# Altium footprint library Semicon-Discrete.pcblib: 205 footprints (part 11 of 13)
Each footprint in its own frame and in the unit in brackets; x right, y up, seen from the top. Pads: shape width x height; smd on the part's side, far side on the other; paste and mask are expansions set on the pad; w line width, h text height; cw(c..) or ccw(c..) is an arc to the next point about the centre after c.
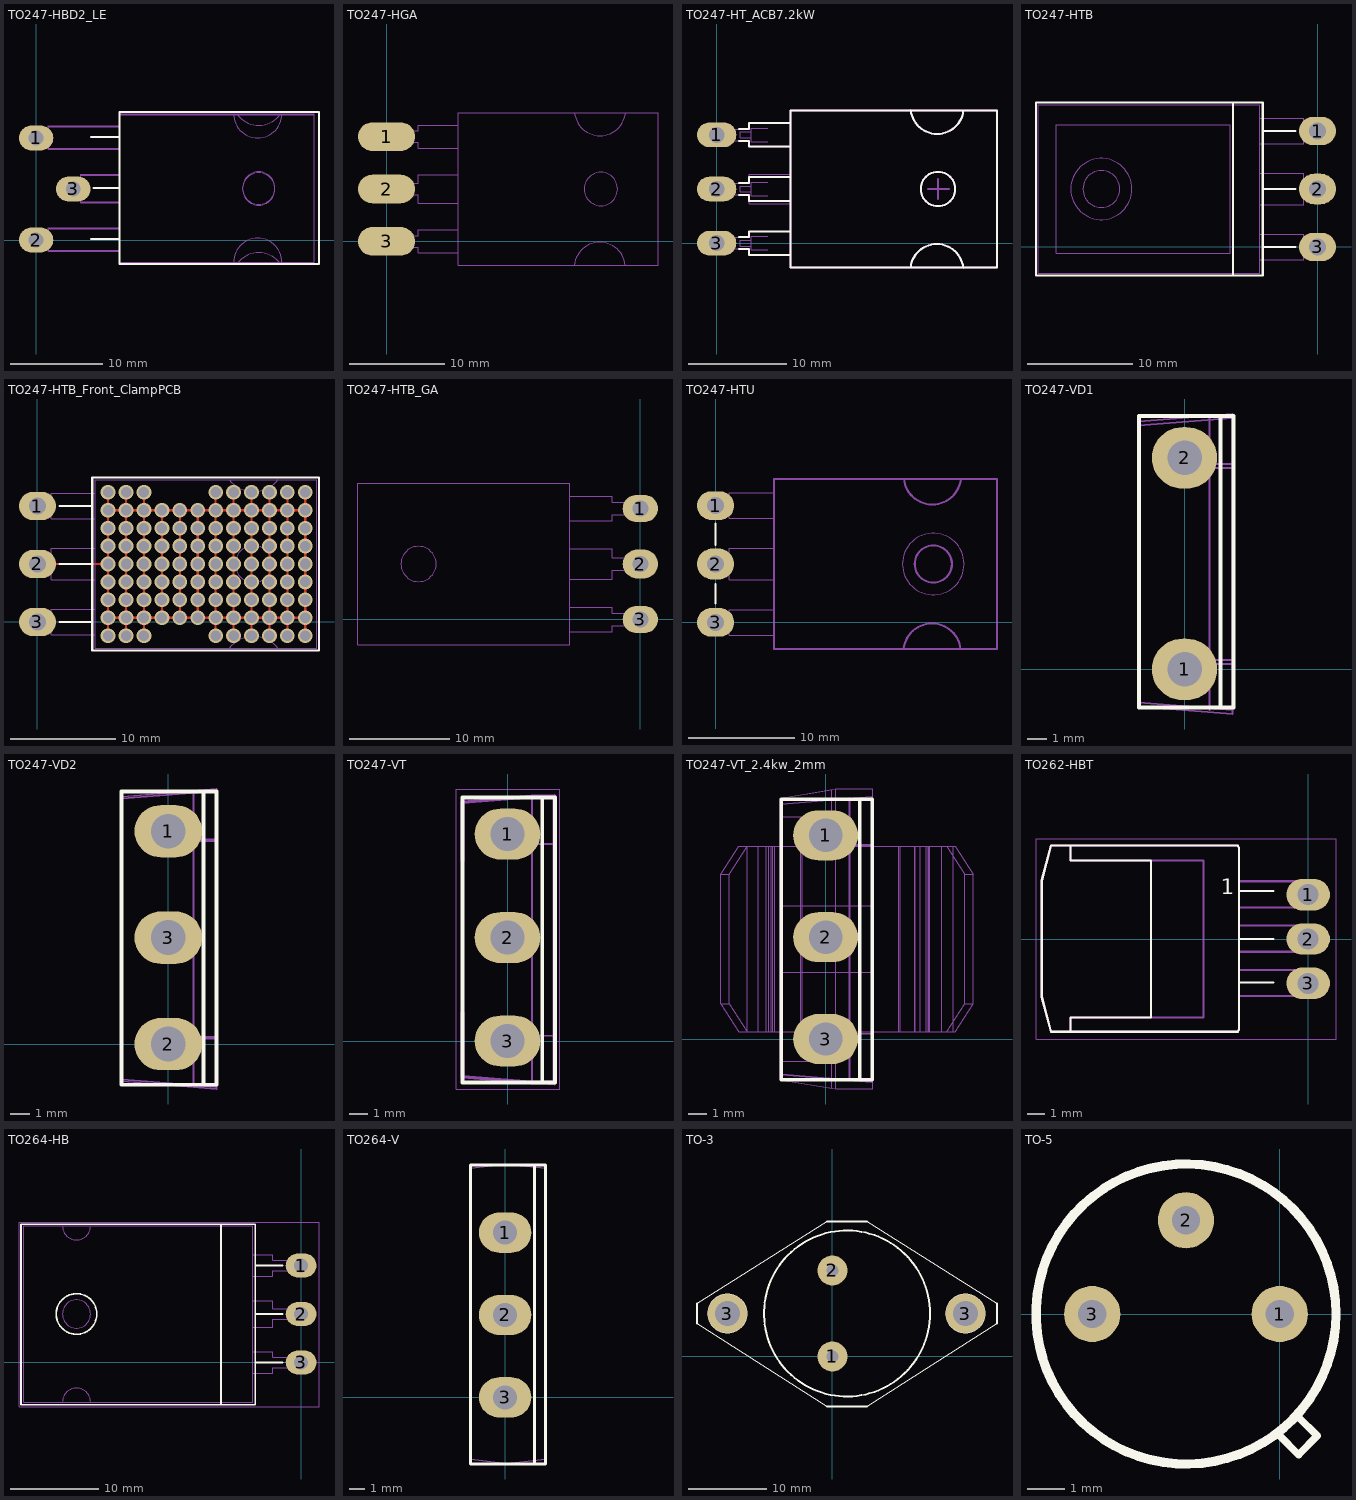
[diagram p10: the footprints below, top view; thin cyan lines are the x and y axes]

## TO247-HBD2_LE [mm]
height 5
pads (3):
  oval 3.7x2.7 hole 1.6: 1(0,11) 2(0,0) 3(4,5.5)
TopOverlay:
  lines w0.2: 5.9,0.1 9,0.1 ; 5.9,11.1 9,11.1 ; 6.2,5.6 9,5.6 ; 9,5.6 9,13.8 30.5,13.8 30.5,-2.6 9,-2.6 9,5.6
TopSolder:
  region: 30.1,13.6 9.1,13.6 9.1,-2.4 30.1,-2.4
2-TopCompOutl:
  circle w0.1: c24,5.5 r1.75
  lines w0.1: 9,-1.2 1.3,-1.2 1.3,-0.6 0,-0.6 0,0 0,0.6 1.3,0.6 1.3,1.2 9,1.2 ; 9,4 4.8,4 4.8,4.9 3.5,4.9 3.5,5.5 3.5,6.1 4.8,6.1 4.8,7 9,7 ; 9,9.8 1.3,9.8 1.3,10.4 0,10.4 0,11 0,11.6 1.3,11.6 1.3,12.2 9,12.2 ; 21.7,-2.5 cw(c24,-4.3) 26.336,-2.548 ; 21.7,13.5 ccw(c24,15.3) 26.336,13.548 ; 9,-2.5 9,13.5 30,13.5 30,-2.5 9,-2.5
4-TopCourty:
  lines w0.1: -0.525,0 0.525,0 ; 0,-0.525 0,0.525
7-TopAssy:
  circle w0.1: c24,5.6 r1.75
  lines w0.1: 9,-1.1 1.3,-1.1 1.3,-0.5 0,-0.5 0,0.1 0,0.7 1.3,0.7 1.3,1.3 9,1.3 ; 9,4.1 4.8,4.1 4.8,5 3.5,5 3.5,5.6 3.5,6.2 4.8,6.2 4.8,7.1 9,7.1 ; 9,9.9 1.3,9.9 1.3,10.5 0,10.5 0,11.1 0,11.7 1.3,11.7 1.3,12.3 9,12.3 ; 21.3,-2.4 cw(c23.9,-2.4) 26.5,-2.4 ; 21.3,13.6 ccw(c23.9,13.6) 26.5,13.6 ; 9,-2.4 9,13.6 30,13.6 30,-2.4 9,-2.4
  text ".Designator" at 10.25,3.925 h2.2
3D body "TO247-HBD2_LE.STEP": height 3.65, standoff -3.2, extent -0.4,-2.6 30.9,13.6

## TO247-HGA [mm] "TO247 Horisontaly Mounted Resesed In PCB"
height 5
pads (3):
  oval 6x3 smd: 1(0,11) 2(0,5.5) 3(0,0)
2-TopCompOutl:
  circle w0.1: c22.5,5.5 r1.75
  lines w0.1: 7.5,-1.2 3.3,-1.2 3.3,-0.6 -1.6,-0.6 -1.6,0 -1.6,0.6 3.3,0.6 3.3,1.2 7.5,1.2 ; 7.5,4 3.3,4 3.3,4.9 -1.6,4.9 -1.6,5.5 -1.6,6.1 3.3,6.1 3.3,7 7.5,7 ; 7.5,9.8 3.3,9.8 3.3,10.4 -1.6,10.4 -1.6,11 -1.6,11.6 3.3,11.6 3.3,12.2 7.5,12.2 ; 19.7,-2.5 cw(c22.383,-2.798) 25.069,-2.52 ; 19.731,13.52 ccw(c22.417,13.798) 25.1,13.5 ; 7.5,-2.5 7.5,13.5 28.5,13.5 28.5,-2.5 7.5,-2.5
4-TopCourty:
  lines w0.1: -0.525,0 0.525,0 ; 0,-0.525 0,0.525
7-TopAssy:
  circle w0.1: c22.5,5.5 r1.75
  lines w0.1: 7.5,-1.2 3.3,-1.2 3.3,-0.6 -1.6,-0.6 -1.6,0 -1.6,0.6 3.3,0.6 3.3,1.2 7.5,1.2 ; 7.5,4 3.3,4 3.3,4.9 -1.6,4.9 -1.6,5.5 -1.6,6.1 3.3,6.1 3.3,7 7.5,7 ; 7.5,9.8 3.3,9.8 3.3,10.4 -1.6,10.4 -1.6,11 -1.6,11.6 3.3,11.6 3.3,12.2 7.5,12.2 ; 19.7,-2.5 cw(c22.383,-2.798) 25.069,-2.52 ; 19.731,13.52 ccw(c22.417,13.798) 25.1,13.5 ; 7.5,-2.5 7.5,13.5 28.5,13.5 28.5,-2.5 7.5,-2.5
  text ".Designator" at 8.85,4.925 h2.2

## TO247-HT_ACB7.2kW [mm] "TO247 Horisontaly Mounted Resesed In PCB"
height 5
pads (3):
  oval 4x2.5 hole 1.6: 1(0,11) 2(0,5.5) 3(0,0)
TopOverlay:
  circle w0.2: c22.5,5.5 r1.75
  circle w0.2: c22.5,5.5 r1.75
  lines w0.2: 2.25,-0.6 3.3,-0.6 3.3,-1.2 7.5,-1.2 ; 2.25,0.6 3.3,0.6 3.3,1.2 7.5,1.2 ; 2.25,4.9 3.3,4.9 3.3,4.3 7.5,4.3 ; 2.25,6.1 3.3,6.1 3.3,6.7 7.5,6.7 ; 2.25,10.4 3.3,10.4 3.3,9.8 7.5,9.8 ; 2.25,11.6 3.3,11.6 3.3,12.2 7.5,12.2 ; 7.5,-2.5 28.5,-2.5 ; 7.5,-2.5 7.5,13.5 ; 7.5,-2.5 28.5,-2.5 ; 7.5,-2.5 7.5,13.5 ; 7.5,13.5 28.5,13.5 ; 7.5,13.5 28.5,13.5 ; 28.5,-2.5 28.5,13.5 ; 28.5,-2.5 28.5,13.5 ; 19.7,-2.5 cw(c22.383,-2.798) 25.069,-2.52 ccw(c22.383,-2.798) 19.7,-2.5 ; 19.731,13.52 ccw(c22.417,13.798) 25.1,13.5 cw(c22.417,13.798) 19.731,13.52
BottomOverlay:
  lines w0.2: 2.375,-0.625 3.05,-0.625 3.05,-1.25 3.45,-1.25 ; 2.375,0.6 3.05,0.6 3.05,1.225 3.45,1.225 ; 2.375,4.85 3.05,4.85 3.05,4.225 3.45,4.225 ; 2.375,6.075 3.05,6.075 3.05,6.7 3.45,6.7 ; 2.375,10.375 3.05,10.375 3.05,9.75 3.45,9.75 ; 2.375,11.6 3.05,11.6 3.05,12.225 3.45,12.225 ; 3.975,-1.225 5.375,-1.225 ; 3.975,1.2 5.375,1.2 ; 3.975,4.25 5.375,4.25 ; 3.975,6.675 5.375,6.675 ; 3.975,9.775 5.375,9.775 ; 3.975,12.2 5.375,12.2 ; 6.225,-1.2 7.5,-1.2 ; 6.225,1.175 7.5,1.175 ; 6.225,4.275 7.5,4.275 ; 6.225,6.65 7.5,6.65 ; 6.225,9.8 7.5,9.8 ; 6.225,12.175 7.5,12.175 ; 7.5,-1.625 7.5,-2.5 9.325,-2.5 ; 7.5,-0.7 7.5,1.1 ; 7.5,2.5 7.5,4.3 ; 7.5,5.45 7.5,7.3 ; 7.5,8.625 7.5,10.425 ; 7.5,11.525 7.5,13.5 9.325,13.5 ; 10.475,-2.5 12.275,-2.5 ; 10.475,13.5 12.275,13.5 ; 13.6,-2.5 15.45,-2.5 ; 13.6,13.5 15.45,13.5 ; 16.6,-2.5 18.4,-2.5 ; 16.6,13.5 18.4,13.5 ; 19.725,-2.5 21.575,-2.5 ; 19.725,13.5 21.575,13.5 ; 22.7,-2.5 24.5,-2.5 ; 22.7,13.5 24.5,13.5 ; 25.825,-2.5 28.5,-2.5 28.5,-1.3 ; 25.825,13.5 28.5,13.5 28.5,11.55 ; 28.5,-0.425 28.5,1.375 ; 28.5,2.475 28.5,4.275 ; 28.5,5.425 28.5,7.275 ; 28.5,8.6 28.5,10.4
2-TopCompOutl:
  circle w0.2: c22.5,5.5 r1.75
  lines w0.1: 7.5,-1.2 3.3,-1.2 3.3,-0.6 -0.3,-0.6 -0.3,0 -0.3,0.6 3.3,0.6 3.3,1.2 7.5,1.2 ; 7.5,4 3.3,4 3.3,4.9 -0.3,4.9 -0.3,5.5 -0.3,6.1 3.3,6.1 3.3,7 7.5,7 ; 7.5,9.8 3.3,9.8 3.3,10.4 -0.3,10.4 -0.3,11 -0.3,11.6 3.3,11.6 3.3,12.2 7.5,12.2
  lines w0.2: 19.7,-2.5 cw(c22.383,-2.798) 25.069,-2.52 ; 19.731,13.52 ccw(c22.417,13.798) 25.1,13.5 ; 7.5,-2.5 7.5,13.5 28.5,13.5 28.5,-2.5 7.5,-2.5
4-TopCourty:
  lines w0.1: -0.525,0 0.525,0 ; 0,-0.525 0,0.525
5-MCadOutl:
  lines w0.2: 21.475,5.5 22.5,5.5 ; 22.5,4.475 22.5,5.5 ; 22.5,6.525 22.5,5.5 ; 23.625,5.5 22.5,5.5
7-TopAssy:
  circle w0.2: c22.5,5.5 r1.75
  lines w0.1: 3.5,-0.3 2.4,-0.3 2.4,-0.2 2.4,0.3 3.5,0.3 ; 3.5,5.2 2.4,5.2 2.4,5.3 2.4,5.8 3.5,5.8 ; 3.5,10.7 2.4,10.7 2.4,10.8 2.4,11.3 3.5,11.3 ; 5.2,-0.7 3.5,-0.7 3.5,0 3.5,0.7 5.2,0.7 ; 5.2,4.8 3.5,4.8 3.5,5.5 3.5,6.2 5.2,6.2 ; 5.2,10.3 3.5,10.3 3.5,11 3.5,11.7 5.2,11.7 ; 7.5,-1.2 3.3,-1.2 3.3,-0.6 -0.3,-0.6 -0.3,0 -0.3,0.6 3.3,0.6 3.3,1.2 7.5,1.2 ; 7.5,4 3.3,4 3.3,4.9 -0.3,4.9 -0.3,5.5 -0.3,6.1 3.3,6.1 3.3,7 7.5,7 ; 7.5,9.8 3.3,9.8 3.3,10.4 -0.3,10.4 -0.3,11 -0.3,11.6 3.3,11.6 3.3,12.2 7.5,12.2
  lines w0.2: 19.7,-2.5 cw(c22.383,-2.798) 25.069,-2.52 ; 19.731,13.52 ccw(c22.417,13.798) 25.1,13.5 ; 7.5,-2.5 7.5,13.5 28.5,13.5 28.5,-2.5 7.5,-2.5
  text ".Designator" at 10.2,4.8 h2.2
3D body "TO247-HT_ACB7.2kW.STEP": height 3.65, standoff -3.2, extent -0.35,-2.6 27.95,13.6

## TO247-HTB [mm] "TO247 Horisontaly Mounted Backside view"
height 5
pads (3):
  oval 3.5x2.7 hole 1.6: 1(0,11) 3(0,0)
  oval 3.5x2.9 hole 1.6: 2(0,5.5)
TopOverlay:
  lines w0.2: -8,-2.7 -8,13.7 ; -5.2,0 -2.1,0 ; -5.2,11 -2.1,11 ; -2.1,5.5 -5.2,5.5 ; -5.2,5.5 -5.2,13.7 -26.7,13.7 -26.7,-2.7 -5.2,-2.7 -5.2,5.5
2-TopCompOutl:
  circle w0.1: c-20.5,5.5 r1.75
  lines w0.1: -5.5,-1.2 -1.3,-1.2 -1.3,-0.6 0,-0.6 0,0 0,0.6 -1.3,0.6 -1.3,1.2 -5.5,1.2 ; -5.5,4 -1.3,4 -1.3,4.9 0,4.9 0,5.5 0,6.1 -1.3,6.1 -1.3,7 -5.5,7 ; -5.5,9.8 -1.3,9.8 -1.3,10.4 0,10.4 0,11 0,11.6 -1.3,11.6 -1.3,12.2 -5.5,12.2 ; -26.5,-2.5 -5.5,-2.5 -5.5,13.5 -26.5,13.5 -26.5,-2.5
4-TopCourty:
  lines w0.1: -0.525,0 0.525,0 ; 0,-0.525 0,0.525
7-TopAssy:
  circle w0.1: c-20.5,5.5 r1.75
  circle w0.1: c-20.5,5.5 r2.9
  lines w0.1: -5.5,-1.2 -1.3,-1.2 -1.3,-0.6 0,-0.6 0,0 0,0.6 -1.3,0.6 -1.3,1.2 -5.5,1.2 ; -5.5,4 -1.3,4 -1.3,4.9 0,4.9 0,5.5 0,6.1 -1.3,6.1 -1.3,7 -5.5,7 ; -5.5,9.8 -1.3,9.8 -1.3,10.4 0,10.4 0,11 0,11.6 -1.3,11.6 -1.3,12.2 -5.5,12.2 ; -26.5,-2.5 -5.5,-2.5 -5.5,13.5 -26.5,13.5 -26.5,-2.5 ; -24.8,-0.6 -8.3,-0.6 -8.3,5.5 -8.3,11.6 -24.8,11.6 -24.8,5.5 -24.8,-0.6
  text ".Designator" at -16.925,4.825 h2.2
3D body "TO247-HTB.STEP": height 5.51, standoff -3, extent -26.75,-2.475 0.35,13.525

## TO247-HTB_Front_ClampPCB [mm]
height 5
pads (3):
  oval 3.5x2.7 hole 1.6: 1(0,11) 2(0,5.5) 3(0,0)
via 22,2.1 diameter 1.4 hole 1
via 20.3,2.1 diameter 1.4 hole 1
via 18.6,2.1 diameter 1.4 hole 1
via 22,8.9 diameter 1.4 hole 1
via 20.3,8.9 diameter 1.4 hole 1
via 18.6,8.9 diameter 1.4 hole 1
via 22,7.2 diameter 1.4 hole 1
via 20.3,7.2 diameter 1.4 hole 1
via 18.6,7.2 diameter 1.4 hole 1
via 16.9,7.2 diameter 1.4 hole 1
via 23.7,7.2 diameter 1.4 hole 1
via 22,5.5 diameter 1.4 hole 1
via 20.3,5.5 diameter 1.4 hole 1
via 18.6,5.5 diameter 1.4 hole 1
via 16.9,5.5 diameter 1.4 hole 1
via 23.7,5.5 diameter 1.4 hole 1
via 22,3.8 diameter 1.4 hole 1
via 20.3,3.8 diameter 1.4 hole 1
via 18.6,3.8 diameter 1.4 hole 1
via 16.9,3.8 diameter 1.4 hole 1
via 23.7,3.8 diameter 1.4 hole 1
via 15.2,5.5 diameter 1.4 hole 1
via 13.5,5.5 diameter 1.4 hole 1
via 11.8,5.5 diameter 1.4 hole 1
via 10.1,5.5 diameter 1.4 hole 1
via 8.4,5.5 diameter 1.4 hole 1
via 6.7,5.5 diameter 1.4 hole 1
via 15.2,7.2 diameter 1.4 hole 1
via 13.5,7.2 diameter 1.4 hole 1
via 11.8,7.2 diameter 1.4 hole 1
via 10.1,7.2 diameter 1.4 hole 1
via 8.4,7.2 diameter 1.4 hole 1
via 6.7,7.2 diameter 1.4 hole 1
via 25.4,7.2 diameter 1.4 hole 1
via 16.9,8.9 diameter 1.4 hole 1
via 15.2,8.9 diameter 1.4 hole 1
via 13.5,8.9 diameter 1.4 hole 1
via 11.8,8.9 diameter 1.4 hole 1
via 10.1,8.9 diameter 1.4 hole 1
via 8.4,8.9 diameter 1.4 hole 1
via 6.7,8.9 diameter 1.4 hole 1
via 23.7,8.9 diameter 1.4 hole 1
via 25.4,8.9 diameter 1.4 hole 1
via 22,10.6 diameter 1.4 hole 1
via 20.3,10.6 diameter 1.4 hole 1
via 18.6,10.6 diameter 1.4 hole 1
via 16.9,10.6 diameter 1.4 hole 1
via 15.2,10.6 diameter 1.4 hole 1
via 13.5,10.6 diameter 1.4 hole 1
via 11.8,10.6 diameter 1.4 hole 1
via 10.1,10.6 diameter 1.4 hole 1
via 8.4,10.6 diameter 1.4 hole 1
via 6.7,10.6 diameter 1.4 hole 1
via 23.7,10.6 diameter 1.4 hole 1
via 25.4,10.6 diameter 1.4 hole 1
via 22,12.3 diameter 1.4 hole 1
via 20.3,12.3 diameter 1.4 hole 1
via 18.6,12.3 diameter 1.4 hole 1
via 16.9,12.3 diameter 1.4 hole 1
via 10.1,12.3 diameter 1.4 hole 1
via 8.4,12.3 diameter 1.4 hole 1
via 6.7,12.3 diameter 1.4 hole 1
via 23.7,12.3 diameter 1.4 hole 1
via 25.4,12.3 diameter 1.4 hole 1
via 22,-1.3 diameter 1.4 hole 1
via 20.3,-1.3 diameter 1.4 hole 1
via 18.6,-1.3 diameter 1.4 hole 1
via 16.9,-1.3 diameter 1.4 hole 1
via 10.1,-1.3 diameter 1.4 hole 1
via 8.4,-1.3 diameter 1.4 hole 1
via 6.7,-1.3 diameter 1.4 hole 1
via 23.7,-1.3 diameter 1.4 hole 1
via 25.4,-1.3 diameter 1.4 hole 1
via 22,0.4 diameter 1.4 hole 1
via 20.3,0.4 diameter 1.4 hole 1
via 18.6,0.4 diameter 1.4 hole 1
via 16.9,0.4 diameter 1.4 hole 1
via 15.2,0.4 diameter 1.4 hole 1
via 13.5,0.4 diameter 1.4 hole 1
via 11.8,0.4 diameter 1.4 hole 1
via 10.1,0.4 diameter 1.4 hole 1
via 8.4,0.4 diameter 1.4 hole 1
via 6.7,0.4 diameter 1.4 hole 1
via 23.7,0.4 diameter 1.4 hole 1
via 25.4,0.4 diameter 1.4 hole 1
via 16.9,2.1 diameter 1.4 hole 1
via 15.2,2.1 diameter 1.4 hole 1
via 13.5,2.1 diameter 1.4 hole 1
via 11.8,2.1 diameter 1.4 hole 1
via 10.1,2.1 diameter 1.4 hole 1
via 8.4,2.1 diameter 1.4 hole 1
via 6.7,2.1 diameter 1.4 hole 1
via 23.7,2.1 diameter 1.4 hole 1
via 25.4,2.1 diameter 1.4 hole 1
via 15.2,3.8 diameter 1.4 hole 1
via 13.5,3.8 diameter 1.4 hole 1
via 11.8,3.8 diameter 1.4 hole 1
via 10.1,3.8 diameter 1.4 hole 1
via 8.4,3.8 diameter 1.4 hole 1
via 6.7,3.8 diameter 1.4 hole 1
via 25.4,3.8 diameter 1.4 hole 1
via 25.4,5.5 diameter 1.4 hole 1
TopLayer:
  lines w0.2: 0,5.5 6.7,5.5 ; 6.7,-1.3 6.7,12.3 ; 6.7,0.4 25.4,0.4 ; 6.7,10.6 25.4,10.6 ; 8.4,-1.3 8.4,12.3 ; 10.1,-1.3 10.1,12.3 ; 11.8,0.4 11.8,10.6 ; 13.5,0.4 13.5,10.6 ; 15.2,0.4 15.2,10.6 ; 16.9,-1.3 16.9,12.3 ; 18.6,-1.3 18.6,12.3 ; 20.3,-1.3 20.3,12.3 ; 22,-1.3 22,12.3 ; 23.7,-1.3 23.7,12.3 ; 25.4,-1.3 25.4,12.3
TopOverlay:
  lines w0.2: 2.1,0 5.2,0 ; 2.1,5.5 5.2,5.5 ; 2.1,11 5.2,11 ; 5.2,5.5 5.2,-2.7 26.7,-2.7 26.7,13.7 5.2,13.7 5.2,5.5
TopSolder:
  rectangle: 5.6,-2.4 26.4,13.4
2-TopCompOutl:
  circle w0.1: c20.5,5.5 r1.75
  lines w0.1: 5.5,-1.2 1.3,-1.2 1.3,-0.6 0,-0.6 0,0 0,0.6 1.3,0.6 1.3,1.2 5.5,1.2 ; 5.5,4 1.3,4 1.3,4.9 0,4.9 0,5.5 0,6.1 1.3,6.1 1.3,7 5.5,7 ; 5.5,9.8 1.3,9.8 1.3,10.4 0,10.4 0,11 0,11.6 1.3,11.6 1.3,12.2 5.5,12.2 ; 18.2,-2.5 cw(c20.5,-4.3) 22.836,-2.548 ; 18.2,13.5 ccw(c20.5,15.3) 22.836,13.548 ; 5.5,-2.5 26.5,-2.5 26.5,13.5 5.5,13.5 5.5,-2.5
4-TopCourty:
  lines w0.1: -0.525,0 0.525,0 ; 0,-0.525 0,0.525
7-TopAssy:
  text ".Designator" at 7.525,4.125 h2.2

## TO247-HTB_GA [mm] "TO247 Horisontaly Mounted Backside view"
height 5
pads (3):
  oval 3.5x2.7 hole 1.6: 1(0,11) 3(0,0)
  oval 3.5x2.9 hole 1.6: 2(0,5.5)
2-TopCompOutl:
  circle w0.1: c-22,5.5 r1.75
  lines w0.1: -7,-1.2 -2.8,-1.2 -2.8,-0.6 -1.5,-0.6 -1.5,0 -1.5,0.6 -2.8,0.6 -2.8,1.2 -7,1.2 ; -7,4 -2.8,4 -2.8,4.9 -1.5,4.9 -1.5,5.5 -1.5,6.1 -2.8,6.1 -2.8,7 -7,7 ; -7,9.8 -2.8,9.8 -2.8,10.4 -1.5,10.4 -1.5,11 -1.5,11.6 -2.8,11.6 -2.8,12.2 -7,12.2 ; -28,-2.5 -28,13.5 -7,13.5 -7,-2.5 -28,-2.5
4-TopCourty:
  lines w0.1: -0.525,0 0.525,0 ; 0,-0.525 0,0.525
7-TopAssy:
  circle w0.1: c-22,5.5 r1.75
  lines w0.1: -7,-1.2 -2.8,-1.2 -2.8,-0.6 0,-0.6 0,0 0,0.6 -2.8,0.6 -2.8,1.2 -7,1.2 ; -7,4 -2.8,4 -2.8,4.9 0,4.9 0,5.5 0,6.1 -2.8,6.1 -2.8,7 -7,7 ; -7,9.8 -2.8,9.8 -2.8,10.4 0,10.4 0,11 0,11.6 -2.8,11.6 -2.8,12.2 -7,12.2 ; -28,-2.5 -28,13.5 -7,13.5 -7,-2.5 -28,-2.5
  text ".Designator" at -19.15,4.7 h2.2

## TO247-HTU [mm] "TO247 Horisontaly Mounted Under PCB"
height 6
pads (3):
  oval 3.5x2.7 hole 1.6: 1(0,11) 3(0,0)
  oval 3.5x2.9 hole 1.6: 2(0,5.5)
TopOverlay:
  lines w0.2: 0,1.8 0,3.6 ; 0,7.3 0,9.3
2-TopCompOutl:
  lines w0.1: 0.1,0.6 -0.2,0.6 -0.2,-0.6 0.2,-0.6 0.2,0.6 ; -0.2,4.9 -0.2,6.1 0.2,6.1 0.2,4.9 -0.2,4.9 ; -0.2,10.4 -0.2,11.6 0.2,11.6 0.2,10.4 -0.2,10.4
4-TopCourty:
  lines w0.1: -0.525,0 0.525,0 ; 0,-0.525 0,0.525
5-MCadOutl:
  circle w0.2: c20.5,5.5 r1.75
  lines w0.1: 0.2,-0.6 0.2,0.6 ; 0.2,4.9 0.2,6.1 ; 0.2,10.4 0.2,11.6 ; 5.5,-1.2 1.3,-1.2 1.3,-0.6 -0.2,-0.6 -0.2,0.6 1.3,0.6 1.3,1.2 5.5,1.2 ; 5.5,4 1.3,4 1.3,4.9 -0.2,4.9 -0.2,6.1 1.3,6.1 1.3,7 5.5,7 ; 5.5,9.8 1.3,9.8 1.3,10.4 -0.2,10.4 -0.2,11.6 1.3,11.6 1.3,12.2 5.5,12.2
  lines w0.2: 17.7,-2.5 cw(c20.383,-2.798) 23.069,-2.52 ; 17.731,13.52 ccw(c20.417,13.798) 23.1,13.5 ; 5.5,-2.5 26.5,-2.5 26.5,13.5 5.5,13.5 5.5,-2.5
7-TopAssy:
  circle w0.1: c20.5,5.5 r2.9
  text ".Designator" at 3.4,1.5 h2.2
3D body "TO247-HTU.STEP": height 1, standoff -9.9, extent -0.45,-2.575 27.05,13.625

## TO247-VD1 [mm]
pads (2):
  oval 3.4x3.2 hole 1.8: 1(0,0) 2(0,11)
TopOverlay:
  lines w0.2: 1.875,13.175 1.875,-1.975 1.9,-1.975 ; -2.375,-1.975 -2.375,13.175 2.55,13.175 2.55,-1.975 -2.375,-1.975
2-TopCompOutl:
  lines w0.1: -2.4,5.58 -2.4,12.88 2.5,13.28 2.5,-2.12 -2.4,-1.72 -2.4,5.68 ; 1.3,-1.92 1.3,13.18 ; 1.3,0.48 2.5,0.48 ; 1.3,10.68 2.5,10.68
4-TopCourty:
  lines w0.1: -0.525,0 0.525,0 ; 0,-0.525 0,0.525
7-TopAssy:
  circle w0.1: c0,11 r0.6
  circle w0.1: c0,0 r0.6
  lines w0.1: -2.4,5.38 -2.4,12.68 2.5,13.08 2.5,-2.32 -2.4,-1.92 -2.4,5.48 ; 1.3,-2.12 1.3,12.98 ; 1.3,0.28 2.5,0.28 ; 1.3,10.48 2.5,10.48
  text ".Designator" at 0.55,2.325 h2.2

## TO247-VD2 [mm]
pads (3):
  oval 3.5x2.7 hole 1.8: 1(0,11) 2(0,0) 3(0,5.5)
TopOverlay:
  lines w0.2: 1.825,13.05 1.825,-2.1 1.85,-2.1 ; -2.425,-2.1 -2.425,13.05 2.5,13.05 2.5,-2.1 -2.425,-2.1
2-TopCompOutl:
  lines w0.1: -2.4,5.48 -2.4,12.78 2.5,13.18 2.5,-2.22 -2.4,-1.82 -2.4,5.58 ; 1.3,-2.02 1.3,13.08 ; 1.3,0.38 2.5,0.38 ; 1.3,10.58 2.5,10.58
4-TopCourty:
  lines w0.1: -0.525,0 0.525,0 ; 0,-0.525 0,0.525
7-TopAssy:
  circle w0.1: c0,11 r0.6
  circle w0.1: c0,5.5 r0.6
  circle w0.1: c0,0 r0.6
  lines w0.1: -2.4,5.38 -2.4,12.68 2.5,13.08 2.5,-2.32 -2.4,-1.92 -2.4,5.48 ; 1.3,-2.12 1.3,12.98 ; 1.3,0.28 2.5,0.28 ; 1.3,10.48 2.5,10.48
  text ".Designator" at 0.475,1.525 h2.2

## TO247-VT [mm]
pads (3):
  oval 3.5x2.7 hole 1.8: 1(0,11) 2(0,5.5) 3(0,0)
TopOverlay:
  lines w0.2: 1.85,12.95 1.85,-2.2 1.875,-2.2 ; -2.4,-2.2 -2.4,12.95 2.525,12.95 2.525,-2.2 -2.4,-2.2
2-TopCompOutl:
  lines w0.1: -2.4,5.38 -2.4,12.68 2.5,13.08 2.5,-2.32 -2.4,-1.92 -2.4,5.48 ; 1.3,-2.12 1.3,12.98 ; 1.3,0.28 2.5,0.28 ; 1.3,10.48 2.5,10.48
4-TopCourty:
  circle w0.1: c0,0 r0.35
  lines w0.05: -2.725,-2.55 2.775,-2.55 2.775,13.4 -2.725,13.4 -2.725,-2.55
  lines w0.1: -0.525,0 0.525,0 ; 0,-0.525 0,0.525
7-TopAssy:
  lines w0.1: -2.4,5.38 -2.4,12.68 2.5,13.08 2.5,-2.32 -2.4,-1.92 -2.4,5.48 ; 1.3,-2.12 1.3,12.98 ; 1.3,0.28 2.5,0.28 ; 1.3,10.48 2.5,10.48
  text ".Designator" at -1.625,13.65 h2.2
13-SMDTopOverlay:
  lines w0.2: -2.4,1.5 -2.4,-1.9 1.3,-2.2 2.5,-2.2 2.5,13 1.3,13 -2.4,12.7 -2.4,9.6
  text ".Designator" at -4,12.4 h2.2
3D body "TO247-VT.STEP": height 28.5, standoff -3.2, extent -2.7,-6 2.551,17

## TO247-VT_2.4kw_2mm [mm] "TO247-VT_2.4kw_2mm"
pads (3):
  oval 3.5x2.7 hole 1.8: 1(0,11) 2(0,5.5) 3(0,0)
TopOverlay:
  lines w0.2: 1.85,12.95 1.85,-2.2 1.875,-2.2 ; -2.4,-2.2 -2.4,12.95 2.525,12.95 2.525,-2.2 -2.4,-2.2
2-TopCompOutl:
  lines w0.1: -2.4,5.38 -2.4,12.68 2.5,13.08 2.5,-2.32 -2.4,-1.92 -2.4,5.48 ; 1.3,-2.12 1.3,12.98 ; 1.3,0.28 2.5,0.28 ; 1.3,10.48 2.5,10.48
4-TopCourty:
  lines w0.1: -0.525,0 0.525,0 ; 0,-0.525 0,0.525
5-MCadOutl:
  drawing of 175 lines, arcs and shapes, not listed
7-TopAssy:
  circle w0.1: c0,0 r0.6
  circle w0.1: c0,5.5 r0.6
  circle w0.1: c0,11 r0.6
  lines w0.1: -2.4,5.38 -2.4,12.68 2.5,13.08 2.5,-2.32 -2.4,-1.92 -2.4,5.48 ; 1.3,-2.12 1.3,12.98 ; 1.3,0.28 2.5,0.28 ; 1.3,10.48 2.5,10.48
  text ".Designator" at 0.4,1.6 h2.2
3D body "TO247-VT_2.4kw_2mm.STEP": height 29.5, standoff -3.2, extent -6,-2.6 7.645,13.6

## TO262-HBT [mm] "TO262 lay down with tab facing up"
height 5
pads (3):
  oval 2.5x1.8 hole 1.2: 1(0,2.54) 2(0,0) 3(0,-2.54)
TopOverlay:
  lines w0.1: -13.617,-4.5 -9,-4.5 -9,4.5 -13.617,4.5
  lines w0.127: -13.617,-5.317 -13.617,-4.5 ; -13.617,4.5 -13.617,5.353 ; -3.967,-2.5 -2,-2.5 ; -3.967,0.768 -3.967,-0.732 -3.967,-1.772 -3.967,-3.272 -3.967,-5.21 -4.035,-5.317 -4.167,-5.317 -14.731,-5.317 -15.267,-3.317 -15.267,3.353 -14.731,5.353 -4.167,5.353 -4.035,5.353 -3.967,5.246 -3.967,2.75 ; -2,0 -3.967,0 -3.967,1.808 -3.967,2.75 ; -2,2.75 -3.967,2.75
  text "1" at -5,2.25 h1.52
2-TopCompOutl:
  lines w0.1: -13.617,-4.5 -6,-4.5 -6,4.5 -13.617,4.5
  lines w0.127: -13.617,-5.317 -13.617,-4.5 ; -13.617,4.5 -13.617,5.353 ; -0.517,-2.922 -0.517,-2.122 ; -0.517,-0.382 -0.517,0.418 ; -0.517,2.158 -0.517,2.958 ; -3.967,-3.272 -1.067,-3.272 -0.667,-3.272 -0.667,-2.922 -0.017,-2.922 -0.017,-2.122 -0.667,-2.122 -0.667,-1.772 -1.067,-1.772 -3.967,-1.772 ; -3.967,-3.272 -3.967,-5.21 -4.035,-5.317 -4.167,-5.317 -14.731,-5.317 -15.267,-3.317 -15.267,3.353 -14.731,5.353 -4.167,5.353 -4.035,5.353 -3.967,5.246 -3.967,3.308 ; -3.967,-3.272 -3.967,-1.772 ; -3.967,-1.772 -3.967,-0.732 ; -3.967,-0.732 -1.067,-0.732 -0.667,-0.732 -0.667,-0.382 -0.017,-0.382 -0.017,0.418 -0.667,0.418 -0.667,0.768 -1.067,0.768 -3.967,0.768 ; -3.967,-0.732 -3.967,0.768 ; -3.967,0.768 -3.967,1.808 ; -3.967,1.808 -1.067,1.808 -0.667,1.808 -0.667,2.158 -0.017,2.158 -0.017,2.958 -0.667,2.958 -0.667,3.308 -1.067,3.308 -3.967,3.308 ; -3.967,1.808 -3.967,3.308
4-TopCourty:
  circle w0.1: c0,0 r0.35
  lines w0.05: -15.6,-5.75 -15.6,5.75 1.6,5.75 1.6,-5.75 -15.6,-5.75
  lines w0.1: -0.55,0 0.55,0 ; 0,-0.525 0,0.525
7-TopAssy:
  lines w0.1: -13.617,-4.5 -6,-4.5 -6,4.5 -13.617,4.5
  lines w0.127: -13.617,-5.317 -13.617,-4.5 ; -13.617,4.5 -13.617,5.353 ; -0.517,-2.922 -0.517,-2.122 ; -0.517,-0.382 -0.517,0.418 ; -0.517,2.158 -0.517,2.958 ; -3.967,-3.272 -3.967,-1.772 ; -3.967,-3.272 -3.967,-5.21 -4.035,-5.317 -4.167,-5.317 -14.731,-5.317 -15.267,-3.317 -15.267,3.353 -14.731,5.353 -4.167,5.353 -4.035,5.353 -3.967,5.246 -3.967,3.308 ; -3.967,-3.272 -1.067,-3.272 -0.667,-3.272 -0.667,-2.922 -0.017,-2.922 -0.017,-2.122 -0.667,-2.122 -0.667,-1.772 -1.067,-1.772 -3.967,-1.772 ; -3.967,-1.772 -3.967,-0.732 ; -3.967,-0.732 -3.967,0.768 ; -3.967,-0.732 -1.067,-0.732 -0.667,-0.732 -0.667,-0.382 -0.017,-0.382 -0.017,0.418 -0.667,0.418 -0.667,0.768 -1.067,0.768 -3.967,0.768 ; -3.967,0.768 -3.967,1.808 ; -3.967,1.808 -3.967,3.308 ; -3.967,1.808 -1.067,1.808 -0.667,1.808 -0.667,2.158 -0.017,2.158 -0.017,2.958 -0.667,2.958 -0.667,3.308 -1.067,3.308 -3.967,3.308
  text ".Designator" at -8,-5 h2.2
3D body "TO262-HBT.STEP": height 4.83, standoff -2.5, extent -15,-5.32 0.25,5.35

## TO264-HB [mm] "TO264 Horisontaly mounted Back side View"
height 5
pads (3):
  oval 3.5x2.7 hole 1.6: 1(0,11) 2(0,5.5) 3(0,0)
TopOverlay:
  circle w0.2: c-25.5,5.5 r2.302
  lines w0.2: -9.2,-4.8 -9.1,-4.8 -9.1,15.7 ; -5.2,0 -2.1,0 ; -5.2,5.5 -2.1,5.5 ; -5.2,11 -2.1,11 ; -31.8,-4.8 -5.2,-4.8 -5.2,15.7 -5.3,15.7 -31.8,15.7 -31.8,-4.8
2-TopCompOutl:
  circle w0.1: c-25.5,5.5 r1.6
  lines w0.1: -27.1,-4.5 cw(c-25.5,-4.5) -23.9,-4.5 ; -27.1,15.5 ccw(c-25.5,15.5) -23.9,15.5 ; -5.5,-1.2 -3.2,-1.2 -3.2,-0.6 0,-0.6 0,0 0,0.6 -3.2,0.6 -3.2,1.2 -5.5,1.2 ; -5.5,4 -3.2,4 -3.2,4.9 0,4.9 0,5.5 0,6.1 -3.2,6.1 -3.2,7 -5.5,7 ; -5.5,9.8 -3.2,9.8 -3.2,10.4 0,10.4 0,11 0,11.6 -3.2,11.6 -3.2,12.2 -5.5,12.2 ; -31.5,-4.5 -31.5,15.5 -5.5,15.5 -5.5,-4.5 -31.5,-4.5
4-TopCourty:
  circle w0.1: c0,0 r0.35
  lines w0.05: -32.025,-5.05 2.025,-5.05 2.025,15.925 -32.025,15.925 -32.025,-5.05
  lines w0.1: -0.525,0 0.525,0 ; 0,-0.525 0,0.525
7-TopAssy:
  text ".Designator" at -21.3,5.025 h2.2

## TO264-V [mm]
pads (3):
  oval 3.5x2.7 hole 1.6: 1(0,11) 2(0,5.5) 3(0,0)
TopOverlay:
  lines w0.2: -2.325,15.525 -2.3,15.525 ; 1.9,15.525 1.95,15.525 1.95,-4.45 ; -2.3,15.525 2.7,15.525 2.7,-4.45 -2.3,-4.45 -2.3,15.525
2-TopCompOutl:
  lines w0.1: -2.3,-4.12 -2.3,5.58 -2.3,15.28 0,15.58 2.7,15.28 2.7,-4.12 0.1,-4.42 -2.3,-4.12
4-TopCourty:
  lines w0.1: -0.525,0 0.525,0 ; 0,-0.525 0,0.525
7-TopAssy:
  text ".Designator" at 0.525,1.85 h2.2

## TO-3 [mm]
pads (4):
  round 3.81 hole 1.5: 1(0,0) 2(0,10.922)
  round 5 hole 3.2: 3(-13.335,5.461) 3(16.891,5.461)
TopOverlay:
  circle w0.254: c-13.335,5.461 r2.413
  circle w0.254: c16.891,5.461 r2.413
  circle w0.254: c1.854,5.461 r10.541
  lines w0.2: -17.196,4.191 -17.196,6.731 -0.686,17.145 4.394,17.145 20.904,6.731 20.904,4.191 4.394,-6.35 -0.686,-6.35 -17.196,4.191
4-TopCourty:
  lines w0.1: -0.525,0 0.525,0 ; 0,-0.525 0,0.525
7-TopAssy:
  text ".Designator" at -2,5.15 h2.2

## TO-5 [mil]
pads (3):
  round 60 hole 30: 1(0,0) 2(-100,100) 3(-200,0)
TopOverlay:
  circle w10: c-100,0 r160
  lines w8: 0,-130 20,-150 40,-130 20,-110
4-TopCourty:
  lines w3.94: -20.67,0 20.67,0 ; 0,-20.67 0,20.67
7-TopAssy:
  text ".Designator" at -184.06,-31.5 h86.61